# Altium footprint library OltestLib.PcbLib: 139 footprints (part 6 of 9)
Each footprint in its own frame and in the unit in brackets; x right, y up, seen from the top. Pads: shape width x height; smd on the part's side, far side on the other; paste and mask are expansions set on the pad; w line width, h text height; cw(c..) or ccw(c..) is an arc to the next point about the centre after c.
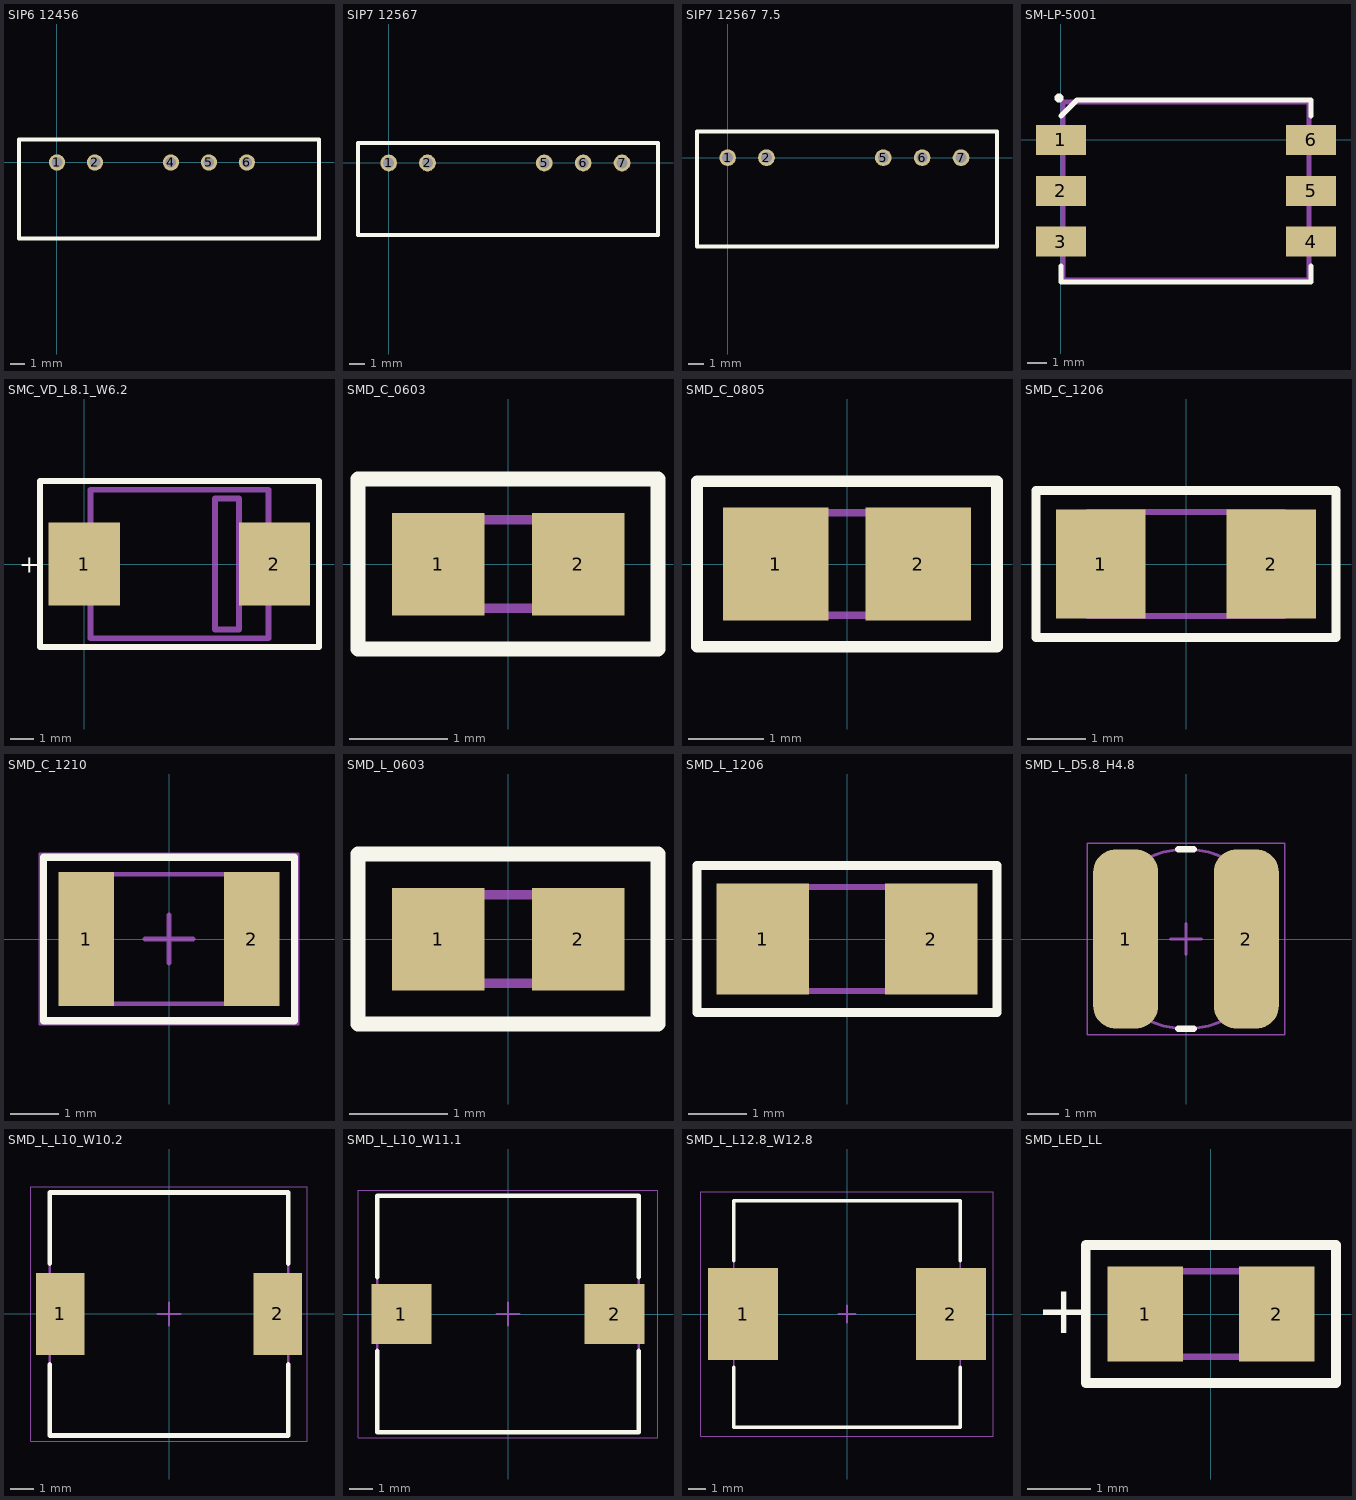
[diagram p5: the footprints below, top view; thin cyan lines are the x and y axes]

## SIP6 12456 [mil]
pads (5):
  round 43 / inner round 0 / far side round 43 hole 28 mask+4: 1(0,0) 2(100,0) 4(300,0) 5(400,0) 6(500,0)
Top Overlay:
  lines w10: -100,-200 -100,60 690,60 690,-200 630,-200 -100,-200
3D body: height 400, standoff 0, extent -99.98,-199.98 689.98,59.98

## SIP7 12567 [mil] "DC/DC"
height 401.57
pads (5):
  round 43 / inner round 0 / far side round 43 hole 28 mask+4: 1(0,0) 2(100,0) 5(400.39,0) 6(500.39,0) 7(600.39,0)
Top Overlay:
  lines w10: -78.74,-185.04 -78.74,51.18 692.91,51.18 692.91,-185.04 615.04,-185.04 -78.74,-185.04
3D body: height 400, standoff 0, extent -78.74,-185.04 692.91,51.18

## SIP7 12567 7.5 [mil] "DC/DC SIP7 12567 Big 19.5x7.5x10.2"
height 401.57
pads (5):
  round 43 / inner round 0 / far side round 43 hole 28 mask+4: 1(0,0) 2(100,0) 5(400.39,0) 6(500.39,0) 7(600.39,0)
Top Overlay:
  lines w10: -78.74,-228.35 692.91,-228.35 692.91,66.93 -78.74,66.93 -78.74,-228.35
3D body: height 401.57, standoff 0, extent -78.74,-228.35 692.91,66.93

## SM-LP-5001 [mm] "Surface Mount Line Matching Transformer"
height 7.4
pads (6):
  rect 2.5x1.5 smd: 1(0,0) 2(0,-2.54) 3(0,-5.08) 4(12.5,-5.08) 5(12.5,-2.54) 6(12.5,0)
Top Overlay:
  circle w0.254: c-0.1,2.1 r0.1
  lines w0.254: 0,-6.3 0,-7.1 12.5,-7.1 12.5,-6.3 ; 0,1.2 0.8,2 12.5,2 12.5,1.2
Mechanical 13:
  lines w0.254: 0.1,-7 0.1,1.9 12.4,1.9 12.4,-7 0.1,-7
3D body "User Library-SM-LP-5001.step": height 7.38, standoff 0.02, extent -0.75,-7.35 13.25,2.25

## SMC_VD_L8.1_W6.2 [mil] "Schottky Diode, 2-Leads, Body 8,13x6,52mm, IPC Low Density"
pads (2):
  rect 120x140 smd: 1(0,0) 2(320,0)
Top Overlay:
  lines w10: -75,-140 395,-140 395,140 -75,140 -75,0 -75,-140
  text "+" at -110,-15 h30
Mechanical 13:
  lines w10: 0,-60 0,0 0,60 10,60 10,20 10,-20 10,-60 0,-60 ; 10,-125 280,-125 310,-125 310,125 280,125 10,125 10,10 10,-41.25 10,-83.75 10,-125 ; 220,-110 220,110 260,110 260,-110 220,-110 ; 310,-60 320,-60 320,60 310,60 310,-10 310,-60
3D body: height 50, standoff 0, extent 0.02,-59.98 9.98,59.98
3D body: height 50, standoff 0, extent 310.02,-59.98 319.98,59.98
3D body: height 107, standoff 105, extent 220.02,-109.98 259.98,109.98
3D body: height 105, standoff 0, extent 10.02,-124.98 309.98,124.98

## SMD_C_0603 [mil] "Chip Capacitor, 2-Leads, Body 1,60x0,80mm, IPC Low Density"
height 31.5
pads (2):
  rect 37x41 smd: 1(-28,0) 2(28,0)
Top Overlay:
  lines w6: -60,-34 60,-34 60,34 -60,34 -60,-34
Mechanical 13:
  lines w3.94: -33.46,-17.72 -33.46,17.72 33.46,17.72 33.46,-17.72 -33.46,-17.72
3D body "CAPC1608X08M.step": height 31.5, standoff 0, extent -33.46,-17.72 33.46,17.72

## SMD_C_0805 [mil] "Chip Capacitor, 2-Leads, Body 2,00x1,25mm, IPC Low Density"
height 23.62
pads (2):
  rect 55x59 smd: 1(-37,0) 2(37,0)
Top Overlay:
  lines w6: -78,-43 78,-43 78,43 -78,43 -78,-43
Mechanical 13:
  lines w3.94: -41.34,-26.57 41.34,-26.57 41.34,26.57 -41.34,26.57 -41.34,-26.57
3D body "CAPC2012X06M.step": height 23.62, standoff 0, extent -41.34,-26.57 41.34,26.57

## SMD_C_1206 [mil] "Chip Capacitor, 2-Leads, Body 3,20x1,60mm, IPC Low Density"
height 62.99
pads (2):
  rect 61x74 smd: 1(-58,0) 2(58,0)
Top Overlay:
  lines w6: -102,-50 102,-50 102,50 -102,50 -102,-50
Mechanical 13:
  lines w3.94: -66.93,-35.43 -66.93,35.43 66.93,35.43 66.93,-35.43 -66.93,-35.43
3D body "CAPC3216X16M.step": height 62.99, standoff 0, extent -66.93,-35.43 66.93,35.43

## SMD_C_1210 [mm] "Chip Capacitor, 2-Leads, Body 3,20x2,50mm, IPC Low Density"
height 2.5
pads (2):
  rect 1.15x2.8 smd: 1(-1.725,0) 2(1.725,0)
Top Overlay:
  lines w0.152: -2.616,-1.702 2.616,-1.702 2.616,1.702 -2.616,1.702 -2.616,-1.702
Mechanical 13:
  lines w0.1: -1.75,-1.35 -1.75,1.35 1.75,1.35 1.75,-1.35 -1.75,-1.35
Mechanical 15:
  lines w0.05: -2.692,-1.778 -2.692,1.778 2.692,1.778 2.692,-1.778 -2.692,-1.778
  lines w0.1: -0.5,0 0.5,0 ; 0,-0.5 0,0.5
3D body "CAPC3225X25M.step": height 2.5, standoff 0, extent -1.75,-1.35 1.75,1.35

## SMD_L_0603 [mil] "Chip Ferrite, 2-Leads, Body 1,60x0,80mm, IPC Low Density"
height 31.5
pads (2):
  rect 37x41 smd: 1(-28,0) 2(28,0)
Top Overlay:
  lines w6: -60,-34 60,-34 60,34 -60,34 -60,-34
Mechanical 13:
  lines w3.94: -33.46,-17.72 -33.46,17.72 33.46,17.72 33.46,-17.72 -33.46,-17.72
3D body "CAPC1608X08M.step": height 31.5, standoff 0, extent -33.46,-17.72 33.46,17.72

## SMD_L_1206 [mm] "Chip Inductor, 2-Leads, Body 3,20x1,60mm, IPC Low Density"
height 1.1
pads (2):
  rect 1.59x1.92 smd: 1(-1.455,0) 2(1.455,0)
Top Overlay:
  lines w0.152: -2.591,-1.27 2.591,-1.27 2.591,1.27 -2.591,1.27 -2.591,-1.27
Mechanical 13:
  lines w0.1: -1.7,-0.9 -1.7,0.9 1.7,0.9 1.7,-0.9 -1.7,-0.9
3D body "INDC3216X11M.step": height 1.1, standoff 0, extent -1.7,-0.9 1.7,0.9

## SMD_L_D5.8_H4.8 [mm] "SMD power inductor"
height 4.8
pads (2):
  rrect70% 2.1x5.8 smd: 1(-1.95,0) 2(1.95,0)
Top Overlay:
  lines w0.2: -0.25,-2.9 0.25,-2.9 ; -0.25,2.9 0.25,2.9
Mechanical 13:
  circle w0.1: c0,0 r2.9
Mechanical 15:
  lines w0.05: -3.2,-3.1 -3.2,3.1 3.2,3.1 3.2,-3.1 -3.2,-3.1
  lines w0.1: -0.5,0 0.5,0 ; 0,-0.5 0,0.5
3D body "User Library-SDR0604.step": height 4.55, standoff 0, extent -2.754,-2.8 2.754,2.8

## SMD_L_L10_W10.2 [mm] "Power Inductor, 2-Leads, Body 10,0x10,2mm"
height 4.8
pads (2):
  rect 2.1x3.56 smd: 1(-4.7,0) 2(4.7,0)
Top Overlay:
  lines w0.2: -5.15,-2.18 -5.15,-5.25 5.15,-5.25 5.15,-2.18 ; -5.15,2.18 -5.15,5.25 5.15,5.25 5.15,2.18
Mechanical 13:
  lines w0.1: -5.15,-5.25 -5.15,5.25 5.15,5.25 5.15,-5.25 -5.15,-5.25
Mechanical 15:
  lines w0.05: -5.975,-5.5 -5.975,5.5 5.975,5.5 5.975,-5.5 -5.975,-5.5
  lines w0.1: -0.5,0 0.5,0 ; 0,-0.5 0,0.5
3D body "SMD_L_L10_W10.2.step": height 4.9, standoff 0, extent -5.1,-5.1 5.1,5.1

## SMD_L_L10_W11.1 [mm] "SMD L L10 W11.1"
height 5
pads (2):
  rect 2.6x2.6 smd: 1(-4.6,0) 2(4.6,0)
Top Overlay:
  lines w0.2: -5.65,-1.6 -5.65,-5.1 5.65,-5.1 5.65,-1.6 ; -5.65,1.6 -5.65,5.1 5.65,5.1 5.65,1.6
Mechanical 13:
  lines w0.1: -5.65,-5.1 5.65,-5.1 5.65,5.1 -5.65,5.1 -5.65,-5.1
Mechanical 15:
  lines w0.05: -6.475,-5.35 6.475,-5.35 6.475,5.35 -6.475,5.35 -6.475,-5.35
  lines w0.1: -0.5,0 0.5,0 ; 0,-0.5 0,0.5
3D body: height 5, standoff 0, extent -5.65,-5.1 5.65,5.1

## SMD_L_L12.8_W12.8 [mil] "Precision Wire Wound Inductor, 2-Leads, Body 12,80x12,80mm, IPC Low Density"
height 314.96
pads (2):
  rect 155x205 smd: 1(-231.3,0) 2(231.3,0)
Top Overlay:
  lines w7.87: -251.97,-118.11 -251.97,-251.97 251.97,-251.97 251.97,-118.11 ; -251.97,118.11 -251.97,251.97 251.97,251.97 251.97,118.11
Mechanical 13:
  lines w3.94: -251.97,-251.97 -251.97,251.97 251.97,251.97 251.97,-251.97 -251.97,-251.97
Mechanical 15:
  lines w1.97: -325,-271.65 -325,271.65 325,271.65 325,-271.65 -325,-271.65
  lines w3.94: -19.68,0 19.69,0 ; 0,-19.68 0,19.68
3D body "INDP128128X80M.step": height 318.9, standoff 0, extent -255.91,-251.97 255.91,251.97

## SMD_LED_LL [mil] "Chip Diode, 2-Leads, Body 2,00x1,25mm, IPC Low Density"
height 31.5
pads (2):
  rect 47x59 smd: 1(-41,0) 2(41,0)
Top Overlay:
  lines w6: -78,-43 78,-43 78,43 -78,43 -78,-43
  text "+" at -109,-12 h30
Mechanical 13:
  lines w3.94: -41.34,-26.57 41.34,-26.57 41.34,26.57 -41.34,26.57 -41.34,-26.57
3D body: height 31.5, standoff 0, extent 25.59,-26.57 41.34,26.57
3D body: height 31.5, standoff 0, extent -41.34,-26.57 -25.59,26.57
3D body: height 31.5, standoff 0, extent -25.59,-26.57 25.59,26.57